# Altium footprint library E-Card.PcbLib: 26 footprints (part 1 of 2)
Each footprint in its own frame and in the unit in brackets; x right, y up, seen from the top. Pads: shape width x height; smd on the part's side, far side on the other; paste and mask are expansions set on the pad; w line width, h text height; cw(c..) or ccw(c..) is an arc to the next point about the centre after c.
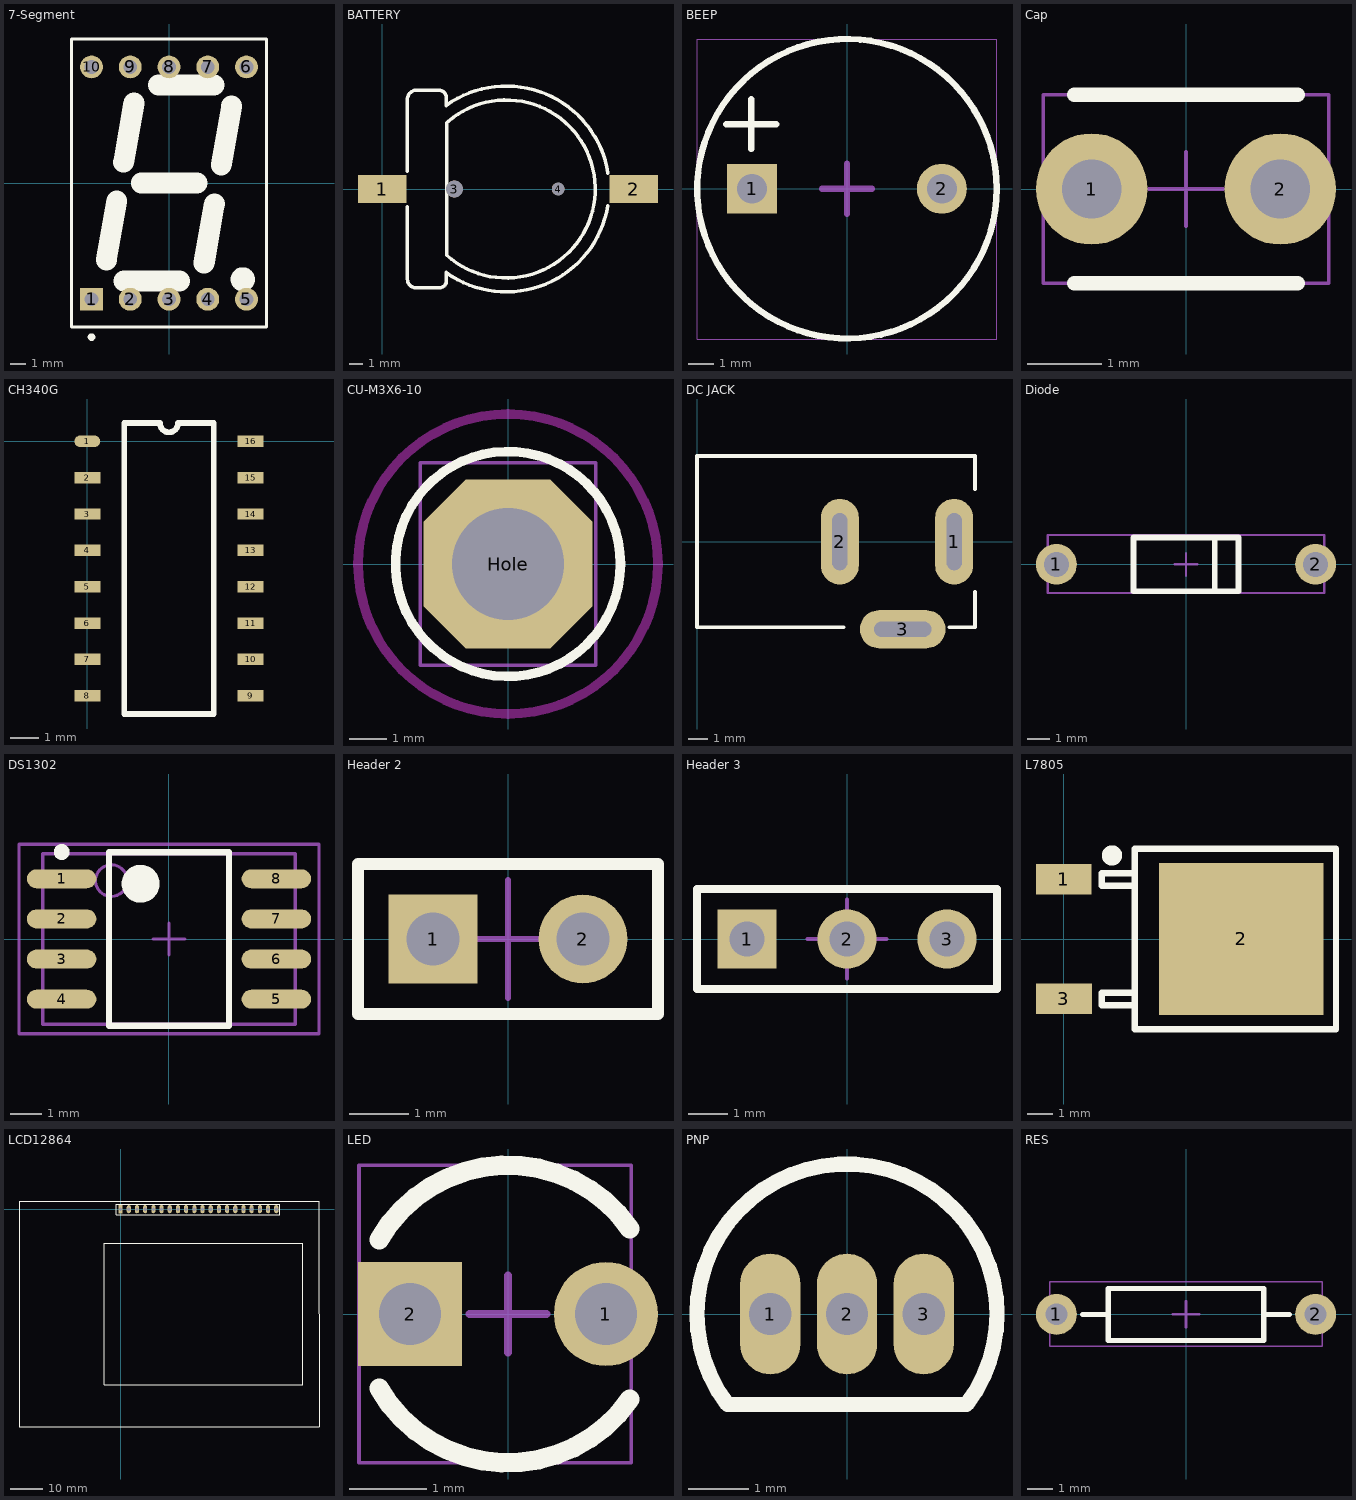
[diagram p0: the footprints below, top view; thin cyan lines are the x and y axes]

## 7-Segment [mm] "LED, 7-Segment Display, 14.2 mm, RHD; 10 Leads; Row Space 15.24 mm; Pitch 2.54 mm"
height 8.25
pads (10):
  rect 1.5x1.5 hole 0.9: 1(-5.08,-7.62)
  round 1.5 hole 0.9: 2(-2.54,-7.62) 3(0,-7.62) 4(2.54,-7.62) 5(5.08,-7.62) 6(5.08,7.62) 7(2.54,7.62) 8(0,7.62) 9(-2.54,7.62) 10(-5.08,7.62)
Top Overlay:
  circle w1: c4.842,-6.316 r0.296
  circle w0.25: c-5.08,-10.1 r0.125
  lines w0.2: -6.4,-9.45 -6.4,9.45 6.4,9.45 6.4,-9.45 -6.4,-9.45
  lines w1.37: -4.108,-5.054 -3.425,-1.17 ; -2.974,1.368 -2.293,5.255 ; -2.958,-6.429 0.692,-6.426 ; -1.821,0 1.828,0 ; -0.689,6.425 2.96,6.425 ; 2.295,-5.256 2.98,-1.371 ; 3.427,1.169 4.11,5.058
Mechanical 13:
  lines w0.1: -6.4,-9.45 6.4,-9.45 6.4,9.45 -6.4,9.45 -6.4,-9.45
3D body "27762.stp": height 8, standoff -3.5, extent -6.25,-9.5 6.25,9.5

## BATTERY [mm] "CR1220"
pads (4):
  rect 3.5x2 smd: 1(0,0) 2(18.067,0)
  round 1.2 hole 1.2: 3(5.181,0)
  round 0.9 hole 0.9: 4(12.631,0)
Top Overlay:
  lines w0.254: 1.806,-1.27 1.806,-6.5 ccw(c2.406,-6.5) 2.406,-7.1 4.106,-7.1 ccw(c4.106,-6.6) 4.606,-6.6 4.606,-6 ; 1.806,1.27 1.806,6.4 cw(c2.456,6.45) 2.406,7.1 4.106,7.1 ; 4.006,7.1 cw(c4.056,6.55) 4.606,6.6 4.606,6 ; 4.597,-6.016 ccw(c8.906,0) 16.208,-1.2 ; 4.596,6.015 cw(c8.906,0) 16.219,1.137 ; 4.636,-4.767 ccw(c8.906,0) 4.741,4.859 4.636,4.754 4.636,-4.767
3D body "CR1220.STEP": height 4.03, standoff -0.91, extent 0.148,-7.504 18.648,7.493

## BEEP [mm] "7.62脚距，12x9.5蜂鸣器"
height 9.5
pads (2):
  rect 2x2 hole 1.2: 1(-3.8,0)
  round 2 hole 1.2: 2(3.8,0)
Top Overlay:
  circle w0.254: c0,0 r6
  lines w0.254: -4.835,2.591 -2.835,2.591 ; -3.835,1.591 -3.835,3.591
Mechanical 13:
  lines w0.05: -6,-6.02 -6,5.98 6,5.98 6,-6.02 -6,-6.02
Mechanical 15:
  lines w0.254: -1,0 1,0 ; 0,-1 0,1
3D body "beep-d12000x9600.stp": height 9.8, standoff -4, extent -6,-6.02 6,5.98

## Cap [mm]
pads (2):
  round 1.5 hole 0.8: 1(-1.27,0) 2(1.27,0)
Top Overlay:
  lines w0.2: -1.5,-1.27 1.5,-1.27 ; -1.5,1.27 1.5,1.27
Mechanical 13:
  lines w0.05: -1.921,-1.27 -1.921,1.27 1.921,1.27 1.921,-1.27 -1.921,-1.27
Mechanical 15:
  lines w0.05: -0.5,0 0.5,0 ; 0,-0.5 0,0.5
3D body "rad5d-0.1.stp": height 5.43, standoff -3, extent -1.927,-1.27 1.926,1.27

## CH340G [mm] "USB to TTL Serial / UART"
pads (16):
  oval 0.9x0.4 smd: 1(0,0)
  rect 0.9x0.4 smd: 2(0,-1.27) 3(0,-2.54) 4(0,-3.81) 5(0,-5.08) 6(0,-6.35) 7(0,-7.62) 8(0,-8.89) 9(5.7,-8.89) 10(5.7,-7.62) 11(5.7,-6.35) 12(5.7,-5.08) 13(5.7,-3.81) 14(5.7,-2.54) 15(5.7,-1.27) 16(5.7,0)
Top Overlay:
  lines w0.2: 1.285,-9.525 4.415,-9.525 4.415,0.635 3.167,0.635 cw(c2.85,0.635) 2.532,0.635 1.285,0.635 1.285,-9.525
3D body "SOP-16.STEP": height 1.55, standoff -0.05, extent -0.282,-9.445 5.982,0.555

## CU-M3X6-10 [mm] "10mm长M3六角铜柱"
height 10
pads (1):
  oct 4.5x4.5 hole 3: Hole(0,0)
Top Overlay:
  circle w0.254: c0,0 r3
Keep-Out Layer:
  circle w0.254: c0,0 r4
Mechanical 1:
  circle w0.15: c0,0 r1.5
Mechanical 13:
  lines w0.1: -2.34,-2.702 -2.34,2.702 2.34,2.702 2.34,-2.702 -2.34,-2.702
Mechanical 15:
  lines w0.1: -1,0 1,0 ; 0,-1 0,1
3D body "cu_m3x6_10.stp": height 5.4, standoff -10.6, extent -2.34,-2.702 2.34,2.702

## DC JACK [mm] "DC Power Jack, 2.5mm, KLD Series, PCB Mount"
pads (3):
  oval 2x4.5 hole 0.8 slot 3 at 90 deg: 1(13.5,0) 2(7.5,0)
  oval 4.5x2 hole 0.8 slot 3 at 0 deg: 3(10.8,-4.6)
Top Overlay:
  lines w0.2: 7.696,-4.5 0,-4.5 0,4.5 14.6,4.5 14.6,2.769 ; 13.259,-4.5 14.6,-4.5 14.6,-2.642
3D body "dc-005.stp": height 11, standoff -3.9, extent 0,-4.725 14,4.725

## Diode [mm] "二极管封装（针式）"
height 2.8
pads (2):
  round 1.8 hole 1.1: 1(-5.715,0) 2(5.715,0)
Top Overlay:
  lines w0.254: 1.27,-1.188 1.27,1.188 ; -2.318,-1.188 2.318,-1.188 2.318,1.188 -2.318,1.188 -2.318,-1.188
Mechanical 13:
  lines w0.1: -6.096,-1.26 -6.096,1.29 6.096,1.29 6.096,-1.26 -6.096,-1.26
Mechanical 15:
  lines w0.1: -0.5,0 0,0 ; 0,-0.5 0,0 ; 0,0.5 0,0 ; 0.508,0 0,0
3D body "do-41.stp": height 2.78, standoff -2.47, extent -6.096,-1.26 6.096,1.29

## DS1302 [mm] "SOP127P780-8,SOP, 8-Leads, Body 5.3x5.3mm, Pitch 1.27mm, IPC Medium Density"
height 2.03
pads (8):
  oval 2.2x0.6 smd: 1(-3.4,1.905) 2(-3.4,0.635) 3(-3.4,-0.635) 4(-3.4,-1.905) 5(3.4,-1.905) 6(3.4,-0.635) 7(3.4,0.635) 8(3.4,1.905)
Top Overlay:
  circle w0.25: c-3.4,2.755 r0.125
  circle w0.6: c-0.9,1.75 r0.3
  lines w0.2: -1.9,-2.75 -1.9,2.75 1.9,2.75 1.9,-2.75 -1.9,-2.75
Mechanical 13:
  circle w0.1: c-1.825,1.85 r0.5
  lines w0.1: -4,-2.7 -4,2.7 4,2.7 4,-2.7 -4,-2.7
Mechanical 15:
  lines w0.1: -0.5,0 0.5,0 ; 0,-0.5 0,0.5 ; -4.75,-3 -4.75,3 4.75,3 4.75,-3 -4.75,-3
3D body "soic127p800-8.stp": height 2.27, standoff 0.02, extent -4,-2.7 4,2.7

## Header 2 [mm] "Connector; Header; 2 Position"
pads (2):
  rect 1.5x1.5 hole 0.9: 1(-1.27,0)
  round 1.5 hole 0.9: 2(1.27,0)
Top Overlay:
  lines w0.2: -2.54,-1.27 -2.54,1.27 2.54,1.27 2.54,-1.27 -2.54,-1.27
Mechanical 13:
  lines w0.01: -2.54,-1.245 2.54,-1.245 2.54,1.255 -2.54,1.255 -2.54,-1.245
Mechanical 15:
  lines w0.1: -1,0 1,0 ; 0,-1 0,1
3D body "sip254p-2v.stp": height 9.01, standoff -2.99, extent -2.54,-1.245 2.54,1.255

## Header 3 [mm] "Connector; Header; 3 Position"
pads (3):
  rect 1.5x1.5 hole 0.9: 1(-2.54,0)
  round 1.5 hole 0.9: 2(0,0) 3(2.54,0)
Top Overlay:
  lines w0.2: -3.81,-1.27 3.81,-1.27 3.81,1.27 -3.81,1.27 -3.81,-1.27
Mechanical 13:
  lines w0.02: -3.81,-1.25 -3.81,1.25 3.81,1.25 3.81,-1.25 -3.81,-1.25
Mechanical 15:
  lines w0.1: -1,0 1,0 ; 0,-1 0,1
3D body "sip254p-3v.stp": height 9.01, standoff -2.99, extent -3.81,-1.25 3.81,1.25

## L7805 [mm] "180度编带包装"
pads (3):
  rect 2.2x1.2 smd: 1(0,2.361) 3(0.004,-2.361)
  rect 6.5x6 smd: 2(7,0)
Top Overlay:
  circle w0.4: c1.9,3.3 r0.2
  lines w0.254: 2.8,2.1 1.5,2.1 1.5,2.6 2.8,2.6 ; 2.804,-2.623 1.504,-2.623 1.504,-2.123 2.804,-2.123 ; 2.8,-3.573 2.8,3.573 10.75,3.573 10.75,-3.573 2.8,-3.573
3D body "TO-252.STEP": height 2.44, standoff 0.03, extent -0.2,-3.27 9.738,3.27

## LCD12864 [mil]
pads (20):
  rect 50x100 hole 39: 1(0,0)
  oval 50x100 hole 39: 2(100,0) 3(200,0) 4(300,0) 5(400,0) 6(500,0) 7(600,0) 8(700,0) 9(800,0) 10(900,0) 11(1000,0) 12(1100,0) 13(1200,0) 14(1300,0) 15(1400,0) 16(1500,0) 17(1600,0) 18(1700,0) 19(1800,0) 20(1900,0)
Top Overlay:
  lines w7.87: -50,-67 1943,-67 1943,62 -50,62 -50,-67
  lines w10: -1239.96,-2657.48 -1239.96,98.43 2421.61,98.43 2421.61,-2657.48 -1239.96,-2657.48 ; -196.85,-2145.67 -196.85,-413.39 2224.41,-413.39 2224.41,-2145.67 -196.85,-2145.67
3D body "LCD12864B.step": height 654.02, standoff -34.96, extent -1239.67,-2653.95 2421.75,101.95

## LED [mm]
pads (2):
  round 1.35 hole 0.8: 1(1.27,0)
  rect 1.35x1.35 hole 0.8: 2(-1.27,0)
Top Overlay:
  lines w0.254: -1.671,-0.965 ccw(c0,0) 1.581,-1.107 ; -1.671,0.965 cw(c0,0) 1.581,1.107
Mechanical 13:
  lines w0.05: -1.93,-1.928 -1.93,1.928 1.598,1.928 1.598,-1.928 -1.93,-1.928
Mechanical 15:
  lines w0.1: -0.5,0 0.5,0 ; 0,-0.5 0,0.5
3D body "dipled3g-2.stp": height 5.4, standoff -3.44, extent -1.93,-1.928 1.598,1.928

## PNP [mm] "TO-92(TO-92-3)"
pads (3):
  oval 1x2 hole 0.7 mask+0.051: 1(-1.27,0) 2(0,0) 3(1.27,0)
Top Overlay:
  lines w0.254: -1.98,-1.5 cw(c0,0) 1.98,-1.5 -1.98,-1.5
Mechanical 13:
  lines w0.1: -1.98,-1.5 cw(c0,0) 1.98,-1.5 -1.98,-1.5
3D body "TO-92.STEP": height 8, standoff -5, extent -2.613,-1.6 2.613,2.604

## RES [mm]
pads (2):
  round 1.6 hole 0.85: 1(-5.08,0) 2(5.08,0)
Top Overlay:
  lines w0.2: -4.064,0 -3.048,0 ; 3.048,0 4.064,0 ; -3.048,-1.016 3.048,-1.016 3.048,1.016 -3.048,1.016 -3.048,-1.016
Mechanical 13:
  lines w0.05: -5.35,-1.245 -5.35,1.275 5.35,1.275 5.35,-1.245 -5.35,-1.245
Mechanical 15:
  lines w0.102: -0.508,0 0,0 ; 0,-0.508 0,0 ; 0,0.508 0,0 ; 0.508,0 0,0
3D body "axial25.stp": height 2.76, standoff -5.01, extent -5.35,-1.245 5.35,1.275